# Altium footprint library Connectors_Old.PcbLib: 246 footprints (part 10 of 18)
Each footprint in its own frame and in the unit in brackets; x right, y up, seen from the top. Pads: shape width x height; smd on the part's side, far side on the other; paste and mask are expansions set on the pad; w line width, h text height; cw(c..) or ccw(c..) is an arc to the next point about the centre after c.
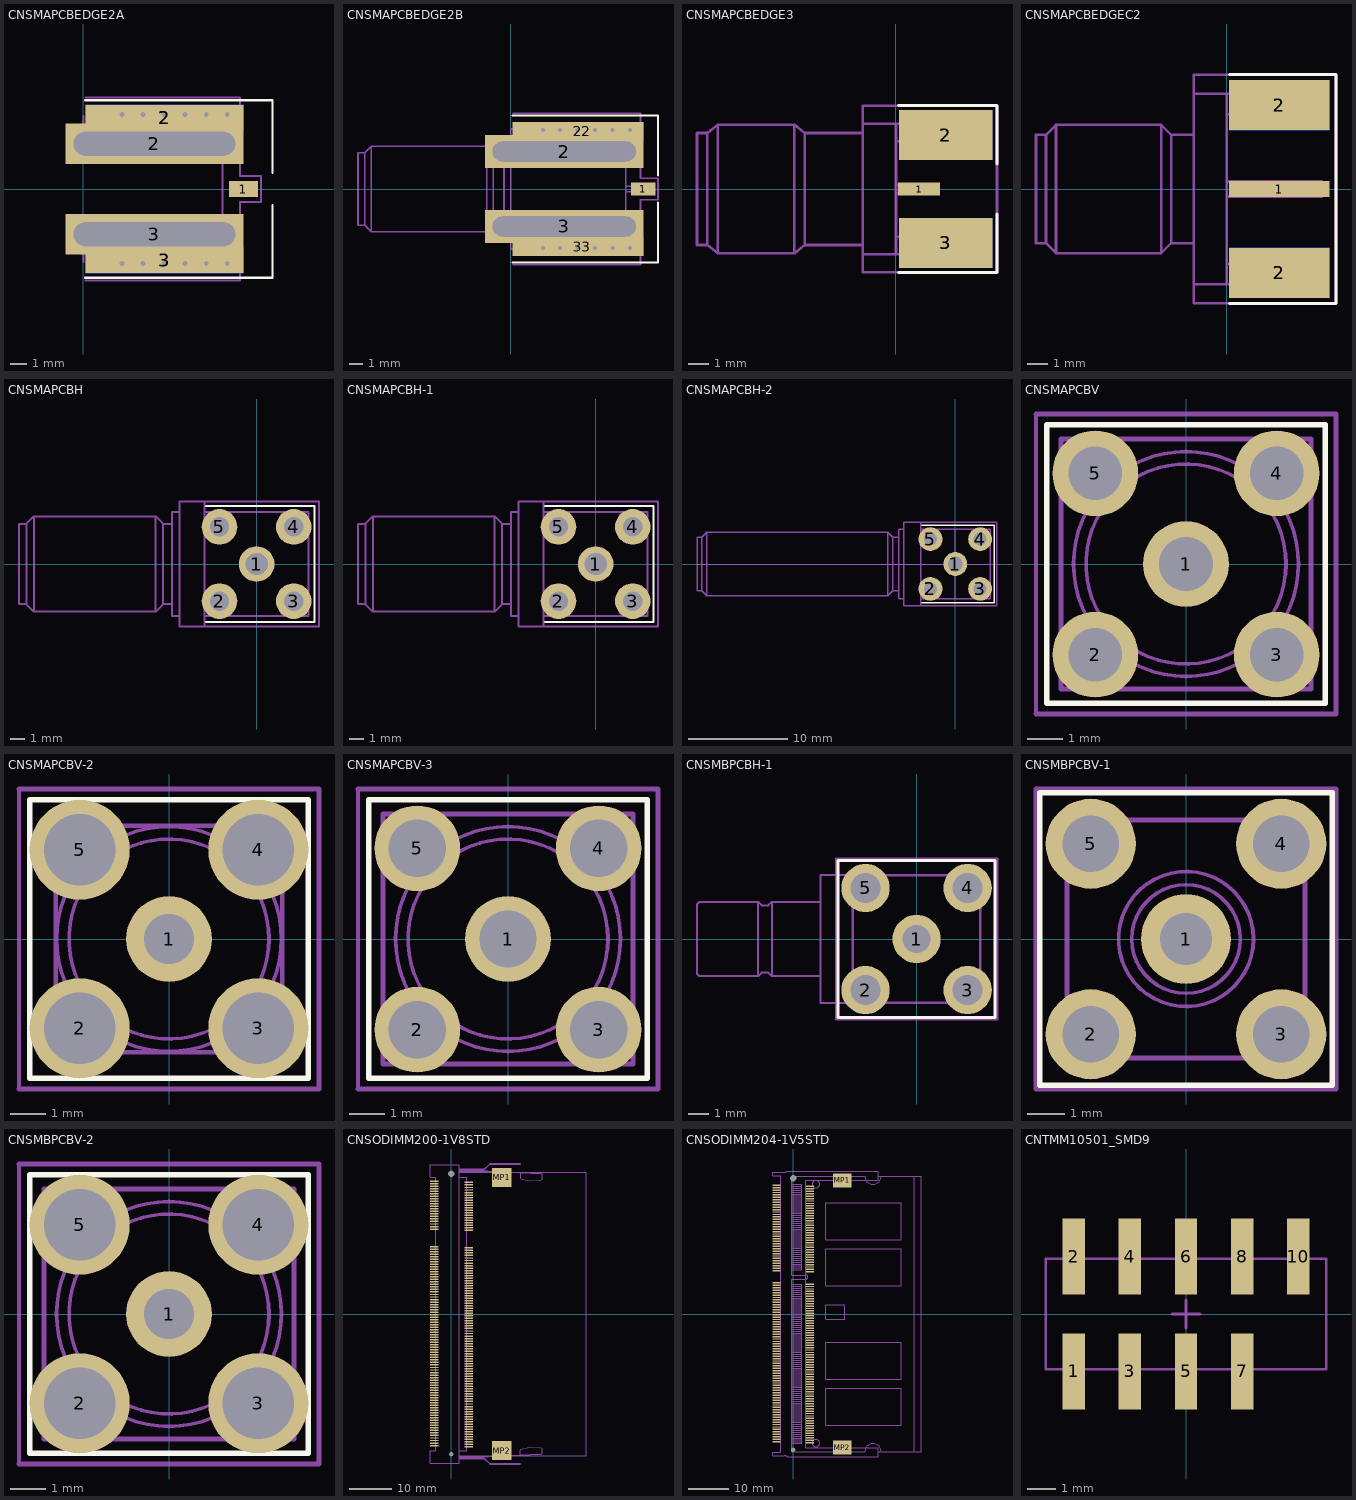
[diagram p9: the footprints below, top view; thin cyan lines are the x and y axes]

## CNSMAPCBEDGE2A [mm] "SMA PCB edge female 2 - pads only"
height 6
pads (7):
  rect 1.8x1 smd paste-3: 1(9.9,0)
  rect 11x2.5 hole 1.5 slot 10 at 0 deg mask+0.254: 2(4.4,2.8) 3(4.4,-2.8)
  rect 9.75x1.6 smd paste-3: 2(5.025,4.4) 3(5.025,-4.4)
  rect 9.75x1.6 smd far side paste-3: 2(5.025,4.4) 3(5.025,-4.4)
via 5,-4.6 diameter 0.65 hole 0.3
via 3.7,-4.6 diameter 0.65 hole 0.3
via 2.4,-4.6 diameter 0.65 hole 0.3
via 6.3,-4.6 diameter 0.65 hole 0.3
via 7.6,-4.6 diameter 0.65 hole 0.3
via 8.9,-4.6 diameter 0.65 hole 0.3
via 8.9,4.6 diameter 0.65 hole 0.3
via 7.6,4.6 diameter 0.65 hole 0.3
via 6.3,4.6 diameter 0.65 hole 0.3
via 2.4,4.6 diameter 0.65 hole 0.3
via 3.7,4.6 diameter 0.65 hole 0.3
via 5,4.6 diameter 0.65 hole 0.3
Top Overlay:
  lines w0.15: 0.131,-5.5 11.7,-5.5 11.7,-1 ; 0.131,5.5 11.7,5.5 11.7,1
Mechanical 15:
  lines w0.127: 0,-4.5 0,-2.8 8.6,-2.8 8.6,2.8 0,2.8 0,4.5 ; 0.15,-5.65 9.7,-5.65 9.7,-0.8 11,-0.8 11,0.8 9.7,0.8 9.7,5.65 0.15,5.65

## CNSMAPCBEDGE2B [mm] "SMA PCB edge female 2 reduced copper bot"
height 6
pads (7):
  rect 1.8x1 smd paste-5: 1(9.9,0)
  rect 11.8x2.5 hole 1.5 slot 10.7 at 0 deg mask+0.254: 2(4,2.8) 3(4,-2.8)
  rect 9.75x1.4 smd paste-10: 2(5.025,4.3) 3(5.025,-4.3)
  rect 8.5x1.4 smd far side paste-10: 2(5.65,4.3) 3(5.65,-4.3)
via 5,-4.4 diameter 0.65 hole 0.3
via 3.7,-4.4 diameter 0.65 hole 0.3
via 2.4,-4.4 diameter 0.65 hole 0.3
via 6.3,-4.4 diameter 0.65 hole 0.3
via 7.6,-4.4 diameter 0.65 hole 0.3
via 8.9,-4.4 diameter 0.65 hole 0.3
via 8.9,4.4 diameter 0.65 hole 0.3
via 7.6,4.4 diameter 0.65 hole 0.3
via 6.3,4.4 diameter 0.65 hole 0.3
via 2.4,4.4 diameter 0.65 hole 0.3
via 3.7,4.4 diameter 0.65 hole 0.3
via 5,4.4 diameter 0.65 hole 0.3
Top Overlay:
  lines w0.15: 0.131,-5.5 11,-5.5 11,-1 ; 0.131,5.5 11,5.5 11,1
Top Solder:
  rectangle: 0,1.5 8.6,5
  rectangle: 0,-5 8.6,-1.5
Bottom Solder:
  rectangle: 0,1.5 8.6,4.3
  rectangle: 0,-4.3 8.6,-1.5
Mechanical 13:
  lines w0.127: -1.8,-3.2 -10.4,-3.2 ; -1.8,3.2 -10.4,3.2 ; -1.3,-2.7 -0.5,-2.7 ; -1.3,2.7 -0.5,2.7 ; 0,-3.2 -0.5,-3.2 -0.5,3.2 0,3.2 ; 8.6,-0.203 10.6,-0.203 10.6,0.203 8.6,0.203 ; -10.9,-2.7 -11.4,-2.7 -11.4,2.7 -10.9,2.7 ; -10.9,-2.7 -10.4,-3.2 ; -10.9,-2.7 -10.9,2.7 ; -10.9,2.7 -10.4,3.2 ; -10.4,-3.2 -9.4,-3.2 ; -10.4,-3.2 -10.4,-3.1 -10.4,3.2 ; -9.4,-3.2 -9.4,-3.2 ; -1.794,3.2 -1.294,2.7 -1.294,-2.7 ; -1.794,3.2 -1.794,-3.2 -1.294,-2.7 ; -1.794,3.2 -1.794,3.2 ; -1.294,-2.7 -1.294,-2.7 ; 0,-3.5 0,-4.5 8.6,-4.5 8.6,-3.5 ; 0,-3.5 8.6,-3.5 ; 0,-3.5 0,3.5 ; 0,3.5 0,4.5 8.6,4.5 8.6,3.5 ; 0,3.5 8.6,3.5 ; 8.6,-3.5 8.6,3.5
Mechanical 15:
  lines w0.127: 0,-4.5 0,-2.8 8.6,-2.8 8.6,2.8 0,2.8 0,4.5 ; 0.15,-5.65 9.7,-5.65 9.7,-0.8 11,-0.8 11,0.8 9.7,0.8 9.7,5.65 0.15,5.65
  text "PCB MILLING LINE" at -4,1.7 h0.8
3D body: height 4.1, standoff -2.9, extent -11.4,-4.472 10.6,4.472

## CNSMAPCBEDGE3 [mm] "SMA PCB edge female EL-FS090-03"
height 6.3
pads (5):
  rect 2.032x0.61 smd: 1(1.118,0)
  rect 4.5x2.4 smd: 2(2.4,2.6) 3(2.4,-2.6)
  rect 4.5x2.4 smd far side: 2(2.4,2.6) 3(2.4,-2.6)
Top Overlay:
  lines w0.15: 0.131,-4.025 4.875,-4.025 4.875,-1.2 ; 0.131,4.025 4.875,4.025 4.875,1.2
Mechanical 13:
  lines w0.127: -1.6,-2.7 -4.4,-2.7 ; -1.6,2.7 -4.4,2.7 ; 0,-2.3 3.8,-2.3 3.8,-3.15 0,-3.15 ; 0,-0.203 1.854,-0.203 1.854,0.203 0,0.203 ; 0,2.3 3.8,2.3 3.8,3.15 0,3.15 ; -9.1,-2.7 -9.6,-2.7 -9.6,2.7 -9.1,2.7 ; -9.1,-2.7 -9.1,2.7 ; -9.1,-2.7 -8.6,-3.1 ; -9.1,2.7 -8.6,3.1 ; -8.6,-3.1 -4.9,-3.1 ; -8.6,-3.1 -8.6,3.1 ; -8.6,3.1 -4.9,3.1 ; -4.9,-3.1 -4.4,-2.7 ; -4.9,-3.1 -4.9,3.1 ; -4.9,3.1 -4.4,2.7 ; -4.4,-2.7 -4.4,-2.7 ; -4.4,-2.7 -4.4,2.7 ; 0,-3.15 0,3.15 ; 0,-3.15 -1.6,-3.15 -1.6,3.15 0,3.15
Mechanical 15:
  lines w0.127: -1.6,-4.025 4.875,-4.025 4.875,4.025 -1.6,4.025 -1.6,-4.025
3D body: height 0.77, standoff 0.02, extent 0,-0.374 2,0.374
3D body: height 1, standoff 0, extent 0,2.3 3.8,3.15
3D body: height -1.7, standoff -2.8, extent 0,2.3 3.8,3.15
3D body: height -1.7, standoff -2.8, extent 0,-3.15 3.8,-2.3
3D body: height 3.5, standoff -2.8, extent -1.6,-3.15 0,3.15
3D body: height 1, standoff 0, extent 0,-3.15 3.8,-2.3
3D body: height 3.08, standoff -2.3, extent -4.6,-2.695 -1.6,2.695
3D body: height 3.08, standoff -2.3, extent -9.6,-2.7 -8.7,2.689
3D body: height 3.48, standoff -2.7, extent -8.85,-3.094 -4.6,3.094

## CNSMAPCBEDGEC2 [mm] "SMA PCB edge female W9.54mm"
height 4.36
pads (5):
  rect 5x0.8 smd: 1(2.625,0)
  rect 5x2.5 smd: 2(2.625,-4.191) 2(2.625,4.191)
  rect 5x2.5 smd far side: 2(2.625,-4.191) 2(2.625,4.191)
Top Overlay:
  lines w0.15: 0.131,-5.715 5.461,-5.715 5.461,5.715 0.131,5.715
Mechanical 13:
  lines w0.127: -1.65,-2.7 -2.769,-2.7 ; -1.65,2.7 -2.769,2.7 ; 0,-3.734 4.75,-3.734 4.75,-4.75 0,-4.75 ; 0,-0.375 4.75,-0.375 4.75,0.375 0,0.375 ; 0,3.734 4.75,3.734 4.75,4.75 0,4.75 ; -9.025,-2.7 -9.025,2.7 ; -9.025,-2.7 -8.525,-3.2 ; -9.025,-2.7 -9.525,-2.7 -9.525,2.7 -9.025,2.7 ; -9.025,2.7 -8.525,3.2 ; -8.525,-3.2 -8.525,-3.1 -8.525,3.2 ; -8.525,-3.2 -7.525,-3.2 ; -8.525,-3.2 -3.269,-3.2 ; -8.525,3.2 -3.269,3.2 ; -7.525,-3.2 -7.525,-3.2 ; -3.269,-3.2 -3.269,3.2 ; -3.269,-3.2 -2.769,-2.7 ; -3.269,3.2 -3.269,3.2 ; -3.269,3.2 -2.769,2.7 ; -2.769,-2.7 -2.769,2.7 ; -2.769,-2.7 -2.769,-2.7 ; 0,-4.75 -1.65,-4.75 -1.65,4.75 0,4.75 ; 0,-4.75 0,-3.5 0,3.5 0,4.75
Mechanical 15:
  lines w0.127: -1.65,-5.715 -1.65,5.715 5.461,5.715 5.461,-5.715 -1.65,-5.715
3D body: height 4.37, standoff -3.56, extent -9.53,-4.77 4.75,4.77

## CNSMAPCBH [mm]
height 10
pads (5):
  round 2.4 hole 1.5: 1(0,0)
  round 2.4 hole 1.3: 2(-2.5,-2.5) 3(2.5,-2.5) 4(2.5,2.5) 5(-2.5,2.5)
Top Overlay:
  lines w0.15: -3.4,-3.9 3.9,-3.9 3.9,3.9 -3.4,3.9
Mechanical 13:
  lines w0.127: -5.7,-2.7 -6.3,-2.7 ; -5.2,-3.5 -5.7,-3.5 -5.7,2.7 ; -5.2,3.5 -5.7,3.5 -5.7,2.7 ; -15.5,-2.7 -16,-2.7 -16,2.7 -15.5,2.7 ; -15.5,-2.7 -15,-3.2 ; -15.5,-2.7 -15.5,2.7 ; -15.5,2.7 -15,3.2 ; -15,-3.2 -14,-3.2 ; -15,-3.2 -15,-3.1 -15,3.2 ; -15,3.2 -6.8,3.2 ; -14,-3.2 -6.8,-3.2 ; -14,-3.2 -14,-3.2 ; -6.8,-3.2 -6.3,-2.7 ; -6.8,-3.2 -6.8,3.2 ; -6.8,3.2 -6.3,2.7 ; -6.8,3.2 -6.8,3.2 ; -6.3,-2.7 -6.3,-2.7 ; -6.3,-2.7 -6.3,2.7 ; -6.3,2.7 -5.7,2.7 ; -3.5,-3.5 3.5,-3.5 3.5,3.5 -3.5,3.5 ; -3.5,-3.5 -3.5,3.5 ; -3.5,-3.5 -3.5,-4.2 -5.2,-4.2 -5.2,4.2 -3.5,4.2 -3.5,3.5
Mechanical 15:
  lines w0.127: -5.2,-4.2 4.2,-4.2 4.2,4.2 -5.2,4.2 -5.2,-4.2
3D body: height 9.53, standoff 3.25, extent -15.2,-3.144 -6.6,3.144
3D body: height 9.08, standoff 3.7, extent -16,-2.695 -15.1,2.695
3D body: height 9.08, standoff 3.7, extent -6.6,-2.695 -5.7,2.695
3D body: height 10, standoff 0, extent -3.5,-3.5 3.5,3.5
3D body: height 10.62, standoff 2.15, extent -5.15,-4.242 -3.5,4.242
3D body: height 9.92, standoff 2.85, extent -5.7,-3.543 -5.2,3.543

## CNSMAPCBH-1 [mm]
height 10
pads (5):
  round 2.4 hole 1.5: 1(0,0)
  round 2.4 hole 1.3: 2(-2.5,-2.5) 3(2.5,-2.5) 4(2.5,2.5) 5(-2.5,2.5)
Top Overlay:
  lines w0.15: -3.4,-3.9 3.9,-3.9 3.9,3.9 -3.4,3.9
Mechanical 13:
  lines w0.127: -5.7,-2.7 -6.3,-2.7 ; -5.2,-3.5 -5.7,-3.5 -5.7,2.7 ; -5.2,3.5 -5.7,3.5 -5.7,2.7 ; -15.5,-2.7 -16,-2.7 -16,2.7 -15.5,2.7 ; -15.5,-2.7 -15,-3.2 ; -15.5,-2.7 -15.5,2.7 ; -15.5,2.7 -15,3.2 ; -15,-3.2 -14,-3.2 ; -15,-3.2 -15,-3.1 -15,3.2 ; -15,3.2 -6.8,3.2 ; -14,-3.2 -6.8,-3.2 ; -14,-3.2 -14,-3.2 ; -6.8,-3.2 -6.3,-2.7 ; -6.8,-3.2 -6.8,3.2 ; -6.8,3.2 -6.3,2.7 ; -6.8,3.2 -6.8,3.2 ; -6.3,-2.7 -6.3,-2.7 ; -6.3,-2.7 -6.3,2.7 ; -6.3,2.7 -5.7,2.7 ; -3.5,-3.5 3.5,-3.5 3.5,3.5 -3.5,3.5 ; -3.5,-3.5 -3.5,3.5 ; -3.5,-3.5 -3.5,-4.2 -5.2,-4.2 -5.2,4.2 -3.5,4.2 -3.5,3.5
Mechanical 15:
  lines w0.127: -5.2,-4.2 4.2,-4.2 4.2,4.2 -5.2,4.2 -5.2,-4.2
3D body: height 6.8, standoff 6, extent -16.053,-0.398 -15.553,0.398
3D body: height 8.6, standoff 4.2, extent -16.027,-2.191 -15.527,2.191
3D body: height 9.53, standoff 3.25, extent -15.2,-3.144 -6.6,3.144
3D body: height 9.08, standoff 3.7, extent -16,-2.695 -15.1,2.695
3D body: height 9.08, standoff 3.7, extent -6.6,-2.695 -5.7,2.695
3D body: height 10, standoff 0, extent -3.4,-3.5 3.6,3.5
3D body: height 10.62, standoff 2.15, extent -5.15,-4.242 -3.5,4.242
3D body: height 9.92, standoff 2.85, extent -5.7,-3.543 -5.2,3.543

## CNSMAPCBH-2 [mm] "SMA connector PCB horizontal R5.0mm L=29.5mm"
height 10
pads (5):
  round 2.4 hole 1.5: 1(0,0)
  round 2.4 hole 1.3: 2(-2.5,-2.5) 3(2.5,-2.5) 4(2.5,2.5) 5(-2.5,2.5)
Top Overlay:
  lines w0.15: -3.4,-3.9 3.9,-3.9 3.9,3.9 -3.4,3.9
Mechanical 13:
  lines w0.127: -5.7,-2.7 -6.3,-2.7 ; -5.2,-3.5 -5.7,-3.5 -5.7,2.7 ; -5.2,3.5 -5.7,3.5 -5.7,2.7 ; -25.5,-2.7 -26,-2.7 -26,2.7 -25.5,2.7 ; -25.5,-2.7 -25,-3.2 ; -25.5,-2.7 -25.5,2.7 ; -25.5,2.7 -25,3.2 ; -25,-3.2 -6.8,-3.2 ; -25,-3.2 -25,-3.1 -25,3.2 ; -25,3.2 -6.8,3.2 ; -6.8,-3.2 -6.3,-2.7 ; -6.8,-3.2 -6.8,3.2 ; -6.8,3.2 -6.3,2.7 ; -6.8,3.2 -6.8,3.2 ; -6.3,-2.7 -6.3,-2.7 ; -6.3,-2.7 -6.3,2.7 ; -6.3,2.7 -5.7,2.7 ; -3.5,-3.5 3.5,-3.5 3.5,3.5 -3.5,3.5 ; -3.5,-3.5 -3.5,3.5 ; -3.5,-3.5 -3.5,-4.2 -5.2,-4.2 -5.2,4.2 -3.5,4.2 -3.5,3.5
Mechanical 15:
  lines w0.1: -26,-2.325 -26,1.975 ; -26,0 3.5,0 ; 0,-3.5 0,3.5
  lines w0.127: -5.2,-4.2 4.2,-4.2 4.2,4.2 -5.2,4.2 -5.2,-4.2
3D body: height 9.55, standoff 3.22, extent -25.1,-3.169 -6.6,3.169
3D body: height 9.08, standoff 3.7, extent -26,-2.695 -25.1,2.695
3D body: height 9.08, standoff 3.7, extent -6.6,-2.695 -5.7,2.695
3D body: height 10, standoff 0, extent -3.4,-3.5 3.6,3.5
3D body: height 10.62, standoff 2.15, extent -5.15,-4.242 -3.5,4.242
3D body: height 9.92, standoff 2.85, extent -5.7,-3.543 -5.2,3.543

## CNSMAPCBV [mm] "SMA connector PCB vertical R5.0mm"
height 13.5
pads (5):
  round 2.4 hole 1.5: 1(0,0) 2(-2.54,-2.54) 3(2.54,-2.54) 4(2.54,2.54) 5(-2.54,2.54)
Top Overlay:
  lines w0.15: -3.9,-3.9 3.9,-3.9 3.9,3.9 -3.9,3.9 -3.9,-3.9
Mechanical 13:
  circle w0.5: c0,0 r0.24
  circle w0.1: c0,0 r3.15
  circle w0.1: c0,0 r2.8
  lines w0.127: -3.5,-3.5 3.5,-3.5 3.5,3.5 -3.5,3.5 -3.5,-3.5
Mechanical 15:
  lines w0.1: -4.2,-4.2 -4.2,4.2
  lines w0.127: -4.2,-4.2 4.2,-4.2 4.2,4.2 -4.2,4.2
3D body: height 9.57, standoff -3.94, extent -3.5,-3.5 3.5,3.501

## CNSMAPCBV-2 [mm] "SMA connector PCB vertical R5.0mm SMD PinInPaste"
height 7.6
pads (5):
  round 2.4 hole 1.4: 1(0,0)
  round 2.8 hole 2: 2(-2.5,-2.5) 3(2.5,-2.5) 4(2.5,2.5) 5(-2.5,2.5)
Top Overlay:
  lines w0.15: -3.9,-3.9 -3.9,3.9 3.9,3.9 3.9,-3.9 -3.9,-3.9
Mechanical 13:
  circle w0.1: c0,0 r2.8
  circle w0.1: c0,0 r3.15
  circle w0.5: c0,0 r0.24
  lines w0.127: -3.175,-3.175 -3.175,3.175 3.175,3.175 3.175,-3.175 -3.175,-3.175
Mechanical 15:
  lines w0.1: -4.2,-4.2 -4.2,4.2
  lines w0.127: -4.2,-4.2 4.2,-4.2 4.2,4.2 -4.2,4.2
3D body: height 1.03, standoff 0.1, extent -3.175,-3.175 3.175,3.175
3D body: height 1.03, standoff -1.27, extent -3.175,1.905 -1.905,3.175
3D body: height 1.03, standoff -1.27, extent -3.175,-3.175 -1.905,-1.905
3D body: height 1.03, standoff -1.27, extent 1.905,-3.175 3.175,-1.905
3D body: height 1.03, standoff -1.27, extent 1.905,1.905 3.175,3.175
3D body: height 7.6, standoff 3.38, extent -3.175,-3.175 3.15,3.162
3D body: height 4.41, standoff 1.03, extent -2.656,-2.667 2.656,2.656
3D body: height 7.6, standoff 3.38, extent -0.45,-0.45 0.446,0.448
3D body: height 7.6, standoff 3.38, extent -2.286,-2.286 2.268,2.277

## CNSMAPCBV-3 [mm] "SMA connector PCB vertical 7x7x9.5mm"
height 9.5
pads (5):
  round 2.4 hole 1.6: 1(0,0) 2(-2.54,-2.54) 3(2.54,-2.54) 4(2.54,2.54) 5(-2.54,2.54)
Top Overlay:
  lines w0.15: -3.9,-3.9 -3.9,3.9 3.9,3.9 3.9,-3.9 -3.9,-3.9
Mechanical 13:
  circle w0.1: c0,0 r2.8
  circle w0.1: c0,0 r3.15
  circle w0.5: c0,0 r0.24
  lines w0.127: -3.5,-3.5 -3.5,3.5 3.5,3.5 3.5,-3.5 -3.5,-3.5
Mechanical 15:
  lines w0.1: -4.2,-4.2 -4.2,4.2
  lines w0.127: -4.2,-4.2 4.2,-4.2 4.2,4.2 -4.2,4.2
3D body: height 1.7, standoff 0, extent -3.5,-3.5 3.5,3.5
3D body: height 9.5, standoff 1.9, extent -3.1,-3.1 3.1,3.1
3D body: height 0, standoff -4, extent -3.175,2.159 -2.286,3.048
3D body: height 0, standoff -4, extent 2.286,2.159 3.175,3.048
3D body: height 0, standoff -4, extent 2.286,-3.048 3.175,-2.159
3D body: height 0, standoff -4, extent -3.175,-3.048 -2.286,-2.159
3D body: height 9.51, standoff 9.5, extent -0.647,-0.647 0.647,0.647
3D body: height 0, standoff -4, extent -0.647,-0.647 0.647,0.647

## CNSMBPCBH-1 [mm] "SMB connector PCB horizontal R5.08mm THT"
height 7.5
pads (5):
  round 2.4 hole 1.4: 1(0,0)
  round 2.4 hole 1.5: 2(-2.54,-2.54) 3(2.54,-2.54) 4(2.54,2.54) 5(-2.54,2.54)
Top Overlay:
  lines w0.15: -3.9,-3.9 3.9,-3.9 3.9,3.9 -3.9,3.9 -3.9,-3.9
Mechanical 13:
  circle w0.5: c0,0 r0.14
  lines w0.1: -4.775,-1.85 -7.2,-1.85 ; -4.775,1.85 -7.2,1.85 ; -3.175,-3.175 -4.775,-3.175 -4.775,3.175 -3.175,3.175 ; -7.888,-1.85 -10.8,-1.85 -10.925,-1.725 -10.925,1.725 -10.8,1.85 -7.888,1.85 ; -7.888,-1.85 -7.888,1.85 ; -7.888,-1.85 -7.713,-1.675 -7.375,-1.675 -7.2,-1.85 ; -7.888,1.85 -7.713,1.675 -7.375,1.675 -7.2,1.85 ; -7.2,-1.85 -7.2,1.85
  lines w0.127: -3.175,-3.175 3.175,-3.175 3.175,3.175 -3.175,3.175 -3.175,-3.175
Mechanical 15:
  lines w0.127: -4,-4 -4,4 4,4 4,-4 -4,-4
3D body: height 6.94, standoff 4.14, extent -10.95,-1.394 -9.95,1.394
3D body: height 7.39, standoff 3.69, extent -10.925,-1.843 -7.887,1.843
3D body: height 7.21, standoff 3.87, extent -7.887,-1.668 -7.2,1.668
3D body: height 7.2, standoff -3.9, extent -0.254,-0.254 0.252,0.253
3D body: height 0.1, standoff -3.9, extent -3.056,2.032 -2.04,3.048
3D body: height 0.1, standoff -3.9, extent 2.04,2.04 3.056,3.056
3D body: height 0.1, standoff -3.9, extent 2.032,-3.056 3.048,-2.04
3D body: height 0.1, standoff -3.9, extent -3.056,-3.056 -2.04,-2.04
3D body: height 8.72, standoff 0.51, extent -3.175,-3.175 3.175,3.175
3D body: height 0.51, standoff 0, extent 2.032,-3.175 3.175,-2.032
3D body: height 0.51, standoff 0, extent -3.175,-3.175 -2.032,-2.032
3D body: height 0.51, standoff 0, extent -3.175,2.032 -2.045,3.175
3D body: height 0.51, standoff 0, extent 2.032,2.032 3.175,3.175
3D body: height 7.39, standoff 3.69, extent -7.2,-1.843 -4.775,1.843
3D body: height 8.71, standoff 2.37, extent -4.775,-3.162 -3.175,3.162

## CNSMBPCBV-1 [mm] "SMB connector PCB vertical R5.08mm THT"
height 7.5
pads (5):
  round 2.4 hole 1.4: 1(0,0)
  round 2.4 hole 1.5: 2(-2.54,-2.54) 3(2.54,-2.54) 4(2.54,2.54) 5(-2.54,2.54)
Top Overlay:
  lines w0.15: -3.9,-3.9 3.9,-3.9 3.9,3.9 -3.9,3.9 -3.9,-3.9
Mechanical 13:
  circle w0.5: c0,0 r0.14
  circle w0.1: c0,0 r1.45
  circle w0.1: c0,0 r1.8
  lines w0.127: -3.175,-3.175 3.175,-3.175 3.175,3.175 -3.175,3.175 -3.175,-3.175
Mechanical 15:
  lines w0.127: -4,-4 -4,4 4,4 4,-4 -4,-4
3D body: height 7.2, standoff -3.9, extent -0.254,-0.254 0.252,0.253
3D body: height 0.1, standoff -3.9, extent -3.056,2.032 -2.04,3.048
3D body: height 0.1, standoff -3.9, extent 2.04,2.04 3.056,3.056
3D body: height 0.1, standoff -3.9, extent 2.032,-3.056 3.048,-2.04
3D body: height 0.1, standoff -3.9, extent -3.056,-3.056 -2.04,-2.04
3D body: height 3.8, standoff 1.8, extent -1.417,-1.417 1.417,1.422
3D body: height 7.6, standoff 1.8, extent -1.838,-1.838 1.838,1.838
3D body: height 7.6, standoff 1.8, extent -1.582,-1.582 1.582,1.582
3D body: height 1.8, standoff 0.5, extent -3.175,-3.175 3.175,3.175
3D body: height 0.5, standoff 0, extent 2.032,-3.175 3.175,-2.032
3D body: height 0.5, standoff 0, extent -3.175,-3.175 -2.032,-2.032
3D body: height 0.5, standoff 0, extent -3.175,2.032 -2.045,3.175
3D body: height 0.5, standoff 0, extent 2.032,2.032 3.175,3.175

## CNSMBPCBV-2 [mm] "SMB connector PCB vertical R5.0mm THT"
height 7.6
pads (5):
  round 2.4 hole 1.4: 1(0,0)
  round 2.8 hole 2: 2(-2.5,-2.5) 3(2.5,-2.5) 4(2.5,2.5) 5(-2.5,2.5)
Top Overlay:
  lines w0.15: -3.9,-3.9 3.9,-3.9 3.9,3.9 -3.9,3.9 -3.9,-3.9
Mechanical 13:
  circle w0.5: c0,0 r0.24
  circle w0.1: c0,0 r3.15
  circle w0.1: c0,0 r2.8
  lines w0.127: -3.5,-3.5 3.5,-3.5 3.5,3.5 -3.5,3.5 -3.5,-3.5
Mechanical 15:
  lines w0.1: -4.2,-4.2 -4.2,4.2
  lines w0.127: -4.2,-4.2 4.2,-4.2 4.2,4.2 -4.2,4.2
3D body: height 7.2, standoff -3.9, extent -0.254,-0.254 0.252,0.253
3D body: height 0.1, standoff -3.9, extent -3.048,2.032 -2.032,3.048
3D body: height 0.1, standoff -3.9, extent 2.032,2.032 3.048,3.048
3D body: height 0.1, standoff -3.9, extent 2.032,-3.048 3.048,-2.032
3D body: height 0.1, standoff -3.9, extent -3.048,-3.048 -2.032,-2.032
3D body: height 3.8, standoff 1.8, extent -1.417,-1.417 1.417,1.422
3D body: height 7.6, standoff 1.8, extent -1.838,-1.838 1.838,1.838
3D body: height 7.6, standoff 1.8, extent -1.582,-1.582 1.582,1.582
3D body: height 1.8, standoff 0.5, extent -3.5,-3.5 3.5,3.5
3D body: height 0.5, standoff 0, extent 2.032,-3.5 3.5,-2.032
3D body: height 0.5, standoff 0, extent -3.5,-3.5 -2.032,-2.032
3D body: height 0.5, standoff 0, extent -3.5,2.032 -2.032,3.5
3D body: height 0.5, standoff 0, extent 2.032,2.032 3.5,3.5

## CNSODIMM200-1V8STD [mm] "Tyco 1473006-4"
height 5.2
pads (204):
  rect 2x0.35 smd: 1(-4.1,31.65) 2(4.1,31.35) 3(-4.1,31.05) 4(4.1,30.75) 5(-4.1,30.45) 6(4.1,30.15) 7(-4.1,29.85) 8(4.1,29.55) 9(-4.1,29.25) 10(4.1,28.95) 11(-4.1,28.65) 12(4.1,28.35) 13(-4.1,28.05) 14(4.1,27.75) 15(-4.1,27.45) 16(4.1,27.15) 17(-4.1,26.85) 18(4.1,26.55) 19(-4.1,26.25) 20(4.1,25.95) 21(-4.1,25.65) 22(4.1,25.35) 23(-4.1,25.05) 24(4.1,24.75) 25(-4.1,24.45) 26(4.1,24.15) 27(-4.1,23.85) 28(4.1,23.55) 29(-4.1,23.25) 30(4.1,22.95) 31(-4.1,22.65) 32(4.1,22.35) 33(-4.1,22.05) 34(4.1,21.75) 35(-4.1,21.45) 36(4.1,21.15) 37(-4.1,20.85) 38(4.1,20.55) 39(-4.1,20.25) 40(4.1,19.95) 41(-4.1,16.05) 42(4.1,15.75) 43(-4.1,15.45) 44(4.1,15.15) 45(-4.1,14.85) 46(4.1,14.55) 47(-4.1,14.25) 48(4.1,13.95) 49(-4.1,13.65) 50(4.1,13.35) 51(-4.1,13.05) 52(4.1,12.75) 53(-4.1,12.45) 54(4.1,12.15) 55(-4.1,11.85) 56(4.1,11.55) 57(-4.1,11.25) 58(4.1,10.95) 59(-4.1,10.65) 60(4.1,10.35) 61(-4.1,10.05) 62(4.1,9.75) 63(-4.1,9.45) 64(4.1,9.15) 65(-4.1,8.85) 66(4.1,8.55) 67(-4.1,8.25) 68(4.1,7.95) 69(-4.1,7.65) 70(4.1,7.35) 71(-4.1,7.05) 72(4.1,6.75) 73(-4.1,6.45) 74(4.1,6.15) 75(-4.1,5.85) 76(4.1,5.55) 77(-4.1,5.25) 78(4.1,4.95) 79(-4.1,4.65) 80(4.1,4.35) 81(-4.1,4.05) 82(4.1,3.75) 83(-4.1,3.45) 84(4.1,3.15) 85(-4.1,2.85) 86(4.1,2.55) 87(-4.1,2.25) 88(4.1,1.95) 89(-4.1,1.65) 90(4.1,1.35) 91(-4.1,1.05) 92(4.1,0.75) 93(-4.1,0.45) 94(4.1,0.15) 95(-4.1,-0.15) 96(4.1,-0.45) 97(-4.1,-0.75) 98(4.1,-1.05) 99(-4.1,-1.35) 100(4.1,-1.65) 101(-4.1,-1.95) 102(4.1,-2.25) 103(-4.1,-2.55) 104(4.1,-2.85) 105(-4.1,-3.15) 106(4.1,-3.45) 107(-4.1,-3.75) 108(4.1,-4.05) 109(-4.1,-4.35) 110(4.1,-4.65) 111(-4.1,-4.95) 112(4.1,-5.25) 113(-4.1,-5.55) 114(4.1,-5.85) 115(-4.1,-6.15) 116(4.1,-6.45) 117(-4.1,-6.75) 118(4.1,-7.05) 119(-4.1,-7.35) 120(4.1,-7.65) 121(-4.1,-7.95) 122(4.1,-8.25) 123(-4.1,-8.55) 124(4.1,-8.85) 125(-4.1,-9.15) 126(4.1,-9.45) 127(-4.1,-9.75) 128(4.1,-10.05) 129(-4.1,-10.35) 130(4.1,-10.65) 131(-4.1,-10.95) 132(4.1,-11.25) 133(-4.1,-11.55) 134(4.1,-11.85) 135(-4.1,-12.15) 136(4.1,-12.45) 137(-4.1,-12.75) 138(4.1,-13.05) 139(-4.1,-13.35) 140(4.1,-13.65) 141(-4.1,-13.95) 142(4.1,-14.25) 143(-4.1,-14.55) 144(4.1,-14.85) 145(-4.1,-15.15) 146(4.1,-15.45) 147(-4.1,-15.75) 148(4.1,-16.05) 149(-4.1,-16.35) 150(4.1,-16.65) 151(-4.1,-16.95) 152(4.1,-17.25) 153(-4.1,-17.55) 154(4.1,-17.85) 155(-4.1,-18.15) 156(4.1,-18.45) 157(-4.1,-18.75) 158(4.1,-19.05) 159(-4.1,-19.35) 160(4.1,-19.65) 161(-4.1,-19.95) 162(4.1,-20.25) 163(-4.1,-20.55) 164(4.1,-20.85) 165(-4.1,-21.15) 166(4.1,-21.45) 167(-4.1,-21.75) 168(4.1,-22.05) 169(-4.1,-22.35) 170(4.1,-22.65) 171(-4.1,-22.95) 172(4.1,-23.25) 173(-4.1,-23.55) 174(4.1,-23.85) 175(-4.1,-24.15) 176(4.1,-24.45) 177(-4.1,-24.75) 178(4.1,-25.05) 179(-4.1,-25.35) 180(4.1,-25.65) 181(-4.1,-25.95) 182(4.1,-26.25) 183(-4.1,-26.55) 184(4.1,-26.85) 185(-4.1,-27.15) 186(4.1,-27.45) 187(-4.1,-27.75) 188(4.1,-28.05) 189(-4.1,-28.35) 190(4.1,-28.65) 191(-4.1,-28.95) 192(4.1,-29.25) 193(-4.1,-29.55) 194(4.1,-29.85) 195(-4.1,-30.15) 196(4.1,-30.45) 197(-4.1,-30.75) 198(4.1,-31.05) 199(-4.1,-31.35) 200(4.1,-31.65)
  round 0 hole 1.6 unplated mask+1: MH1(0,33.4)
  round 0 hole 1.1 unplated mask+1: MH2(0,-33.4)
  rect 4.6x4.5 smd mask+0.95: MP1(12,32.55) MP2(12,-32.55)